# Altium footprint library std-th.PcbLib: 245 footprints (part 5 of 16)
Each footprint in its own frame and in the unit in brackets; x right, y up, seen from the top. Pads: shape width x height; smd on the part's side, far side on the other; paste and mask are expansions set on the pad; w line width, h text height; cw(c..) or ccw(c..) is an arc to the next point about the centre after c.
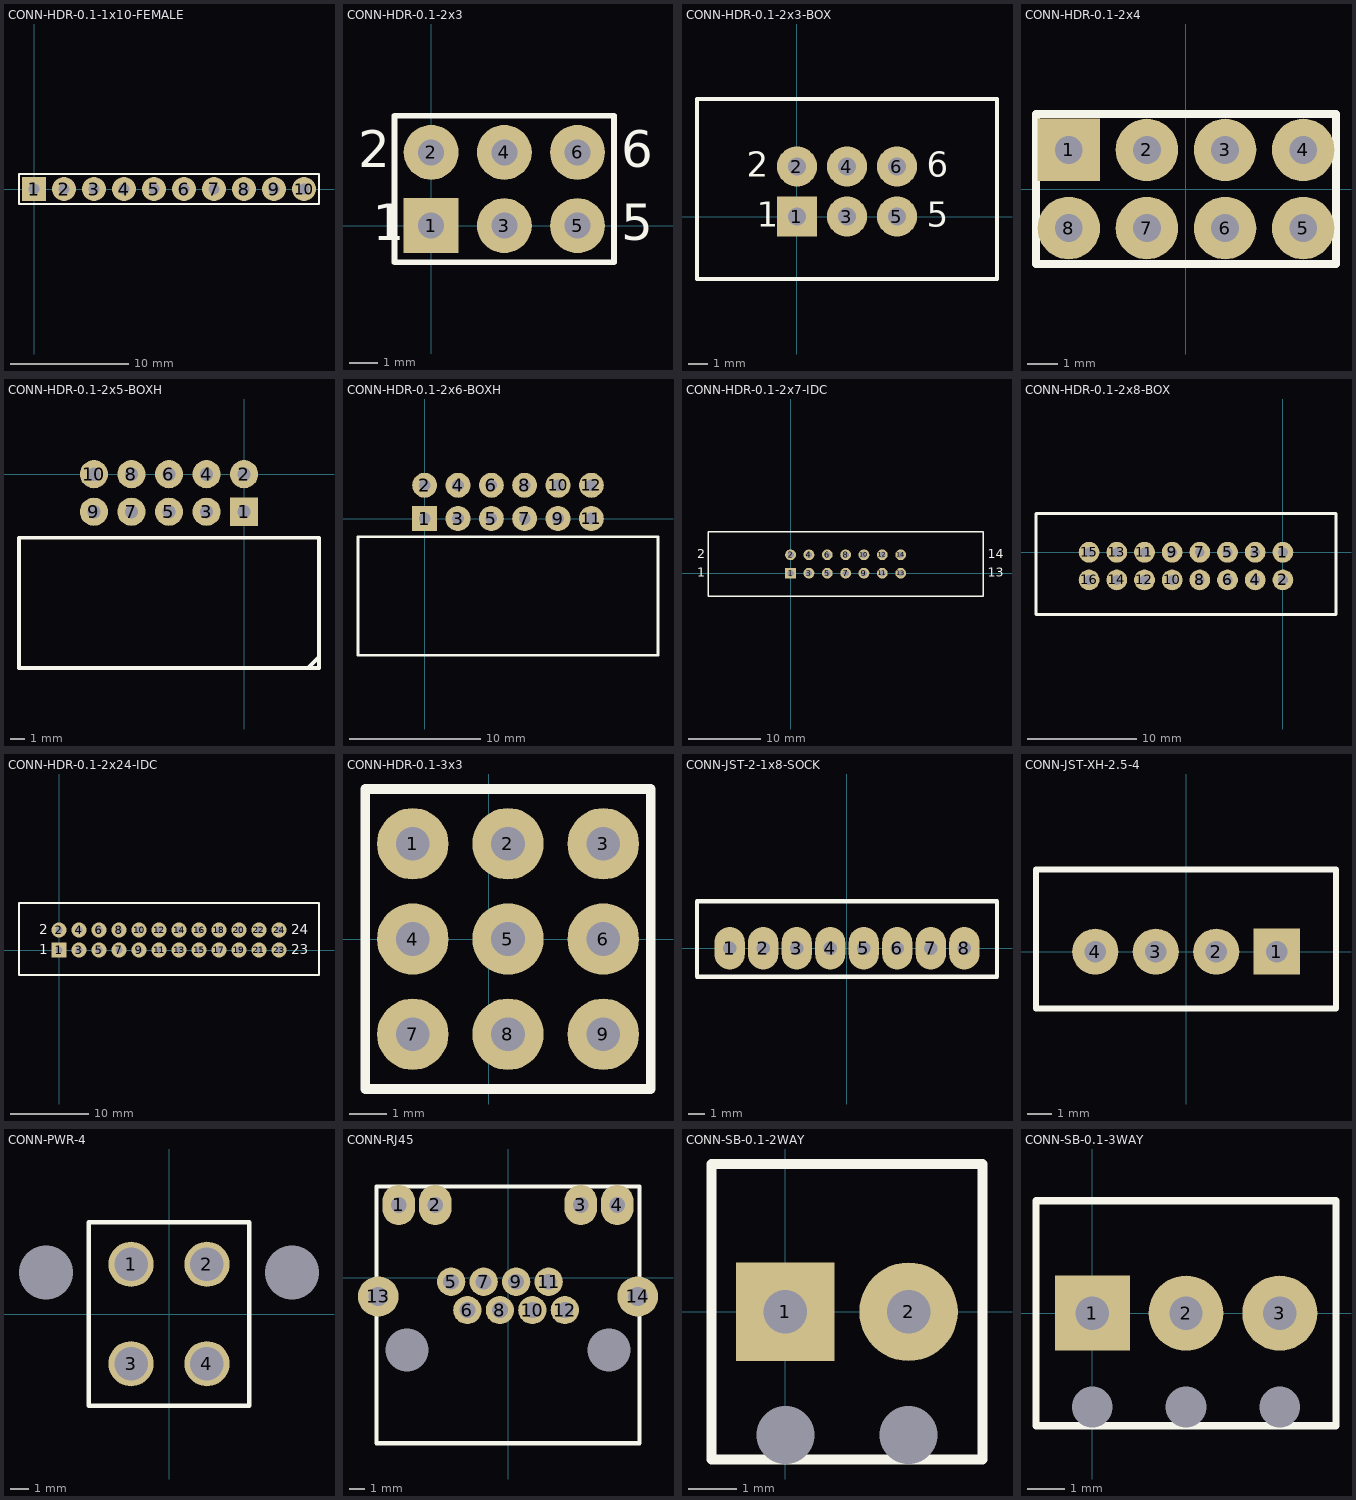
[diagram p4: the footprints below, top view; thin cyan lines are the x and y axes]

## CONN-HDR-0.1-1x10-FEMALE [mil] "Female header, 100 mil pitch, 10 way single row"
height 78.74
pads (10):
  rect 80x80 hole 35.43: 1(0,0)
  round 80 hole 35.43: 2(100,0) 3(200,0) 4(300,0) 5(400,0) 6(500,0) 7(600,0) 8(700,0) 9(800,0) 10(900,0)
Top Overlay:
  lines w7.87: -50,-50 950,-50 950,50 -50,50 -50,-50
3D body: height 334.65, standoff -411.79, extent -50,-50 950,50

## CONN-HDR-0.1-2x3 [mm] "Connector; Header; 3x2 Position"
height 3
pads (6):
  rect 1.905x1.905 hole 0.9: 1(0,0)
  round 1.905 hole 0.9: 2(0,2.54) 3(2.54,0) 4(2.54,2.54) 5(5.08,0) 6(5.08,2.54)
Top Overlay:
  lines w0.2: 1.482,-1.27 6.35,-1.27 ; 6.35,-1.27 -1.27,-1.27 -1.27,3.81 6.35,3.81 6.35,-1.27
  text "1" at -2.032,-0.508 h1.27
  text "2" at -2.54,2.032 h1.27
  text "5" at 6.604,-0.508 h1.27
  text "6" at 6.604,2.032 h1.27
3D body: height 8.5, standoff -3, extent -1.27,-1.25 6.35,3.79

## CONN-HDR-0.1-2x3-BOX [mil] "Connector; Header; 3x2 Position"
height 179.92
pads (6):
  rect 80x80 hole 35.43: 1(0,0)
  round 80 hole 35.43: 2(0,100) 3(100,0) 4(100,100) 5(200,0) 6(200,100)
Top Overlay:
  lines w7.87: -199.99,-125 -199.99,235 400.01,235 400.01,-125 -199.99,-125
  text "6" at 260,80 h50
  text "5" at 260,-20 h50
  text "2" at -100,80 h50
  text "1" at -80,-20 h50
3D body: height 372.83, standoff -125.98, extent -199.99,-125.19 400.01,237.02

## CONN-HDR-0.1-2x4 [mil] "Header, 8 way, 100 mil pitch"
height 393.7
pads (8):
  rect 80x80 hole 35.43: 1(-150,50)
  round 80 hole 35.43: 2(-50,50) 3(50,50) 4(150,50) 5(150,-50) 6(50,-50) 7(-50,-50) 8(-150,-50)
Top Overlay:
  lines w10: -191.99,-95.99 -191.99,96.01 192.01,96.01 192.01,-95.99 -191.99,-95.99
3D body: height 320, standoff -107, extent -191.99,4.01 192.01,96.01
3D body: height 320, standoff -107, extent -191.99,-95.99 192.01,-3.99

## CONN-HDR-0.1-2x5-BOXH [mm] "Connector, Socket, 2 x 5 leads, 100 mil pitch, right angle"
height 8
pads (10):
  rect 1.905x1.905 hole 0.9: 1(0,-2.54)
  round 1.905 hole 0.9: 2(0,0) 3(-2.54,-2.54) 4(-2.54,0) 5(-5.08,-2.54) 6(-5.08,0) 7(-7.62,-2.54) 8(-7.62,0) 9(-10.16,-2.54) 10(-10.16,0)
Top Overlay:
  lines w0.254: 4.328,-13.106 5.07,-12.364 5.07,-12.344 ; -15.23,-4.306 5.07,-4.306 5.07,-13.105 ; -15.23,-4.306 -15.23,-4.306 ; -15.23,-4.306 -15.23,-13.105 5.07,-13.105 ; 5.07,-13.105 5.07,-13.105
3D body: height 8.9, standoff -2.54, extent -15.23,-13.105 5.07,0.33

## CONN-HDR-0.1-2x6-BOXH [mm] "Connector; Header; 6x2 Position"
height 3
pads (12):
  rect 1.905x1.905 hole 0.9: 1(0,0)
  round 1.905 hole 0.9: 2(0,2.54) 3(2.54,0) 4(2.54,2.54) 5(5.08,0) 6(5.08,2.54) 7(7.62,0) 8(7.62,2.54) 9(10.16,0) 10(10.16,2.54) 11(12.7,0) 12(12.7,2.54)
Top Overlay:
  lines w0.2: -5.08,-10.414 17.78,-10.414 17.78,-1.397 -5.08,-1.397 -5.08,-10.414
3D body: height 9.1, standoff -2.97, extent -5.08,-10.36 17.78,2.86

## CONN-HDR-0.1-2x7-IDC [mm] "Connector; Socket 7x2 Positions, 100 mil pitch"
height 10
pads (14):
  rect 1.5x1.5 hole 0.9: 1(0,0)
  round 1.5 hole 0.9: 2(0,2.54) 3(2.54,0) 4(2.54,2.54) 5(5.08,0) 6(5.08,2.54) 7(7.62,0) 8(7.62,2.54) 9(10.16,0) 10(10.16,2.54) 11(12.7,0) 12(12.7,2.54) 13(15.24,0) 14(15.24,2.54)
Top Overlay:
  lines w0.2: -11.43,-3.175 -11.43,5.715 26.67,5.715 26.67,-3.175 -11.43,-3.175
  text "2" at -12.954,2.032 h1.27
  text "1" at -12.954,-0.508 h1.27
  text "14" at 27.305,2.032 h1.27
  text "13" at 27.305,-0.508 h1.27
3D body: height 25.84, standoff -3.2, extent -11.08,-2.98 26.32,5.52

## CONN-HDR-0.1-2x8-BOX [mm] "IDC connector, male, 100 mil pitch, 2 row 16 way"
height 6.35
pads (16):
  round 1.905 hole 0.9: 1(0,0) 2(0,-2.54) 3(-2.54,0) 4(-2.54,-2.54) 5(-5.08,0) 6(-5.08,-2.54) 7(-7.62,0) 8(-7.62,-2.54) 9(-10.16,0) 10(-10.16,-2.54) 11(-12.7,0) 12(-12.7,-2.54) 13(-15.24,0) 14(-15.24,-2.54) 15(-17.78,0) 16(-17.78,-2.54)
Top Overlay:
  lines w0.254: -22.655,-5.715 4.875,-5.715 4.875,3.555 -22.655,3.555 -22.655,-5.715
3D body: height 8.9, standoff -3.5, extent -22.85,-5.52 5.07,3.33

## CONN-HDR-0.1-2x24-IDC [mm] "Connector; Header; 12x2 Position"
height 3
pads (24):
  rect 1.905x1.905 hole 0.9: 1(0,0)
  round 1.905 hole 0.9: 2(0,2.54) 3(2.54,0) 4(2.54,2.54) 5(5.08,0) 6(5.08,2.54) 7(7.62,0) 8(7.62,2.54) 9(10.16,0) 10(10.16,2.54) 11(12.7,0) 12(12.7,2.54) 13(15.24,0) 14(15.24,2.54) 15(17.78,0) 16(17.78,2.54) 17(20.32,0) 18(20.32,2.54) 19(22.86,0) 20(22.86,2.54) 21(25.4,0) 22(25.4,2.54) 23(27.94,0) 24(27.94,2.54)
Top Overlay:
  lines w0.2: -5.08,-3.175 33.02,-3.175 33.02,5.969 -5.08,5.969 -5.08,-3.175
  text "24" at 29.464,2.032 h1.27
  text "23" at 29.464,-0.508 h1.27
  text "2" at -2.54,2.032 h1.27
  text "1" at -2.54,-0.508 h1.27
3D body: height 9.1, standoff -3, extent -5.08,-3.18 33.02,5.92

## CONN-HDR-0.1-3x3 [mil] "Header, 3 row, 9 way, 100 mil pitch"
height 393.7
pads (9):
  round 75 hole 35.43: 1(-80,100) 2(20,100) 3(120,100) 4(-80,0) 5(20,0) 6(120,0) 7(-80,-100) 8(20,-100) 9(120,-100)
Top Overlay:
  lines w10: -129.99,-157.48 -129.99,157.49 170.01,157.49 170.01,-157.48 -129.99,-157.48
3D body: height 335.04, standoff -144.88, extent -129.99,-57.48 170.01,57.49
3D body: height 335.04, standoff -144.88, extent -129.99,-157.48 170.01,-42.51
3D body: height 335.04, standoff -144.88, extent -129.99,42.52 170.01,157.49

## CONN-JST-2-1x8-SOCK [mm] "Connector, 8 way, 2 mm pitch, JST type B8B-PH-K-S"
height 4
pads (8):
  oval 1.8x2.54 hole 0.8: 1(-7,0) 2(-5,0) 3(-3,0) 4(-1,0) 5(1,0) 6(3,0) 7(5,0) 8(7,0)
Top Overlay:
  lines w0.254: -8.95,-1.7 8.95,-1.7 8.95,2.8 -8.95,2.8 -8.95,-1.7
3D body: height 6, standoff -3, extent -8.95,-1.7 8.95,2.8

## CONN-JST-XH-2.5-4 [mm] "Connector, JST-XH, 2.5 mm pitch, 4 way"
height 8
pads (4):
  rect 1.905x1.905 hole 0.9: 1(3.75,0)
  round 1.905 hole 0.9: 2(1.25,0) 3(-1.25,0) 4(-3.75,0)
Top Overlay:
  lines w0.254: -6.2,-2.35 6.2,-2.35 6.2,3.4 -6.2,3.4 -6.2,-2.35
3D body: height 7, standoff -3.4, extent -6.2,-2.35 6.2,3.4

## CONN-PWR-4 [mm] "Molex power connector, 4 way, 2 rows"
height 10
pads (6):
  round 0 hole 3: 0(-6.8,2.29) 0(6.8,2.29)
  round 2.5 hole 1.85: 1(-2.1,2.75) 2(2.1,2.75) 3(-2.1,-2.75) 4(2.1,-2.75)
Top Overlay:
  lines w0.254: -4.445,-5.08 4.445,-5.08 4.445,5.08 -4.445,5.08 -4.445,-5.08
3D body: height 12.8, standoff -3.5, extent -7.8,-5.054 7.8,6.046

## CONN-RJ45 [mil] "Connector, receptable, RJ45 Ethernet"
height 393.7
pads (16):
  oval 80x100 hole 39.37: 1(-270.08,179.58) 2(-179.92,179.58) 3(179.92,179.58) 4(270.08,179.58)
  round 70 hole 39.37: 5(-140.55,-10.18) 6(-100.39,-80.26) 7(-60.23,-10.18) 8(-19.99,-80.26) 9(20.08,-10.18) 10(60.23,-80.26) 11(100.39,-10.18) 12(140.55,-80.26)
  round 100 hole 47.24: 13(-320.84,-46.71) 14(320.84,-46.71)
  round 0 hole 106.3 unplated: 15(-249.99,-179.58) 16(250.01,-179.58)
Top Overlay:
  lines w10: -324.79,-409.58 324.81,-409.58 324.81,224.87 -324.79,224.87 -324.79,-409.58
3D body: height 547.58, standoff -144.79, extent -324.79,-409.58 324.81,224.87

## CONN-SB-0.1-2WAY [mil] "Screw Terminal Block, 1 row 2 way, 100 mil pitch"
height 250
pads (4):
  round 0 hole 47.24: 0(0,-100) 0(100,-100)
  rect 80x80 hole 35.43: 1(0,0)
  round 80 hole 35.43: 2(100,0)
Top Overlay:
  lines w7.87: -60,-120 160,-120 160,120 -60,120 -60,-120
3D body: height 334.65, standoff -137.8, extent -59.05,-122.04 159.06,122.06

## CONN-SB-0.1-3WAY [mil] "Screw Terminal Block, 1 row 3 way, 100 mil pitch"
height 250
pads (6):
  round 0 hole 43.31: 0(0,-100) 0(100,-100) 0(200,-100)
  rect 80x80 hole 35.43: 1(0,0)
  round 80 hole 35.43: 2(100,0) 3(200,0)
Top Overlay:
  lines w7.87: -60,-120 260,-120 260,120 -60,120 -60,-120
3D body: height 334.65, standoff -137.8, extent -59.05,-122.05 259.06,122.05